# Altium footprint library fastener.PcbLib: 3 footprints
Each footprint in its own frame and in the unit in brackets; x right, y up, seen from the top. Pads: shape width x height; smd on the part's side, far side on the other; paste and mask are expansions set on the pad; w line width, h text height; cw(c..) or ccw(c..) is an arc to the next point about the centre after c.
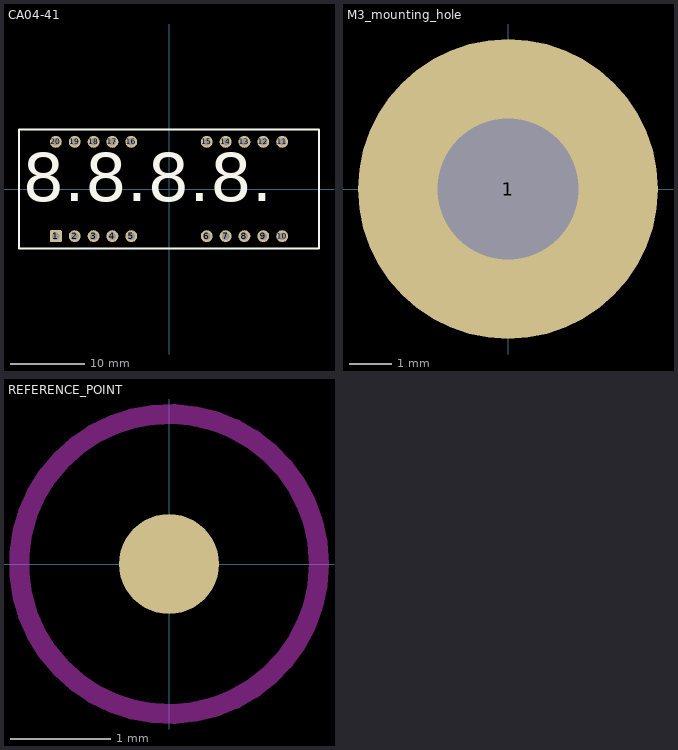
[diagram p0: the footprints below, top view; thin cyan lines are the x and y axes]

## CA04-41 [mm] "kingbright 0.4\" QUAD DIGIT RED GREEN YELLOW LED DISPLAY 4-Digit 7-Segment Thru-Hole Display"
height 11.4
pads (20):
  rrect20% 1.6x1.6 hole 1: 1(-15.24,-6.35)
  round 1.6 hole 1: 2(-12.7,-6.35) 3(-10.16,-6.35) 4(-7.62,-6.35) 5(-5.08,-6.35) 6(5.08,-6.35) 7(7.62,-6.35) 8(10.16,-6.35) 9(12.7,-6.35) 10(15.24,-6.35) 11(15.24,6.35) 12(12.7,6.35) 13(10.16,6.35) 14(7.62,6.35) 15(5.08,6.35) 16(-5.08,6.35) 17(-7.62,6.35) 18(-10.16,6.35) 19(-12.7,6.35) 20(-15.24,6.35)
Top Overlay:
  lines w0.254: -20.2,-8 -20.2,8 20.2,8 20.2,-8 -20.2,-8
  text "8.8.8.8." at -19.685,-3.81 h11
  text "." at -18.415,-6.985 h11
M3_comm_top:
  text ".comment" at -3.81,-5.08 h1.52
3D body "King Bright CA04-41.step": height 6.9, standoff -4.1, extent -20.2,-8 20.2,8

## M3_mounting_hole [mm] "M3_mounting_hole"
pads (1):
  round 7 hole 3.3: 1(0,0)
3D body "mounting hole_um.STEP": height 0, standoff 0, extent -3.5,-3.5 3.5,3.5
3D body "mounting hole_um.STEP": height 0, standoff 0, extent -3.5,-3.5 3.5,3.5

## REFERENCE_POINT [mm]
pads (1):
  round 1 smd paste-1 mask+1: ""(0,0)
Keep-Out Layer:
  circle w0.2: c0,0 r1.5
3D body "reper.STEP": height 0, standoff 0, extent -0.5,-0.5 0.5,0.5